# Altium footprint library Library 3D.PcbLib: 288 footprints (part 12 of 18)
Each footprint in its own frame and in the unit in brackets; x right, y up, seen from the top. Pads: shape width x height; smd on the part's side, far side on the other; paste and mask are expansions set on the pad; w line width, h text height; cw(c..) or ccw(c..) is an arc to the next point about the centre after c.
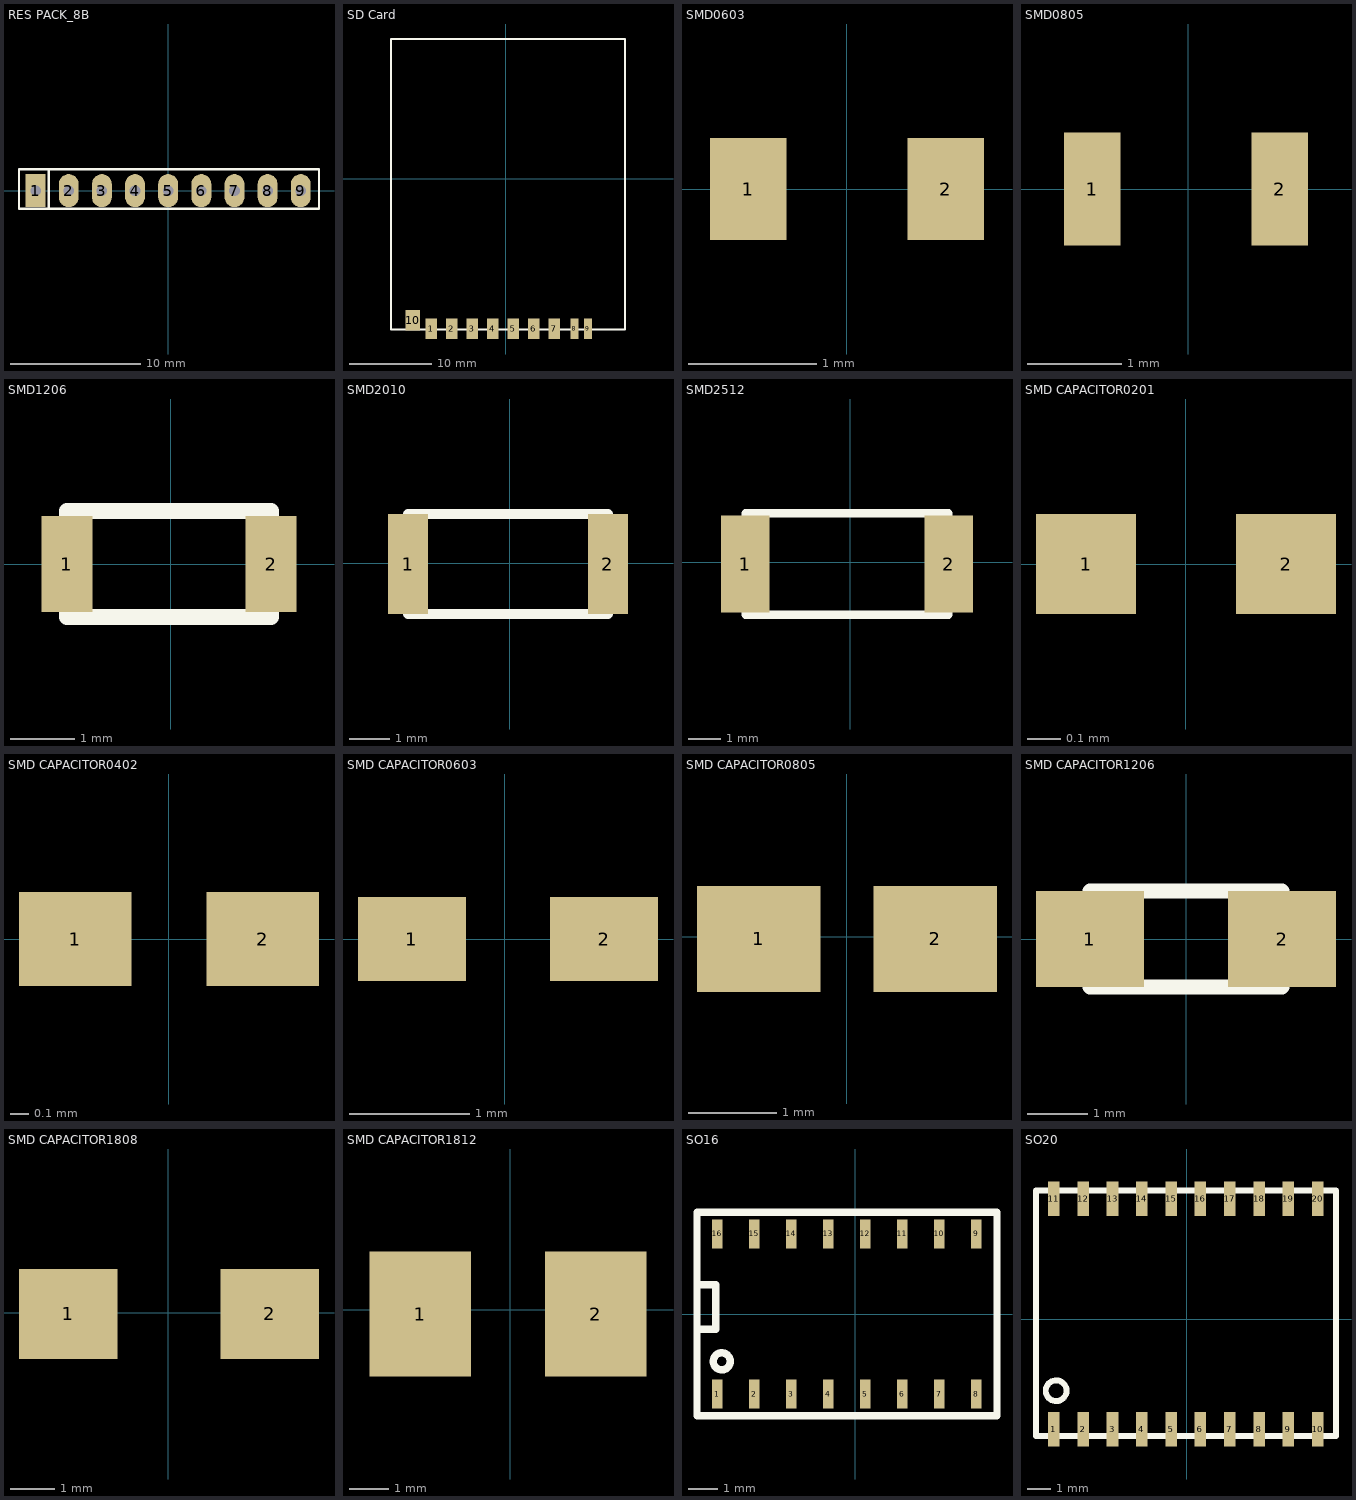
[diagram p11: the footprints below, top view; thin cyan lines are the x and y axes]

## RES PACK_8B [mil]
pads (9):
  rect 60x100 hole 32: 1(-400,0.98)
  oval 60x100 hole 32: 2(-300,0.98) 3(-200,0.98) 4(-100,0.98) 5(0,0.98) 6(100,0.98) 7(200,0.98) 8(300,0.98) 9(400,0.98)
Top Overlay:
  lines w7: -360,-54.02 -360,65.98 ; -450,-54.02 455,-54.02 455,65.98 -450,65.98 -450,-54.02
3D body "SW3dPS-Resistor Networks-1.STEP": height 259.29, standoff -75.35, extent -442.91,-19.02 442.91,30.2

## SD Card [mm]
pads (10):
  rect 1.4x2.5 smd: 1(-9.108,-18.332) 2(-6.619,-18.332) 3(-4.104,-18.332) 4(-1.615,-18.332) 5(0.925,-18.332) 6(3.389,-18.332) 7(5.929,-18.332)
  rect 1x2.5 smd: 8(8.393,-18.332) 9(10.044,-18.332)
  rect 1.8x2.5 smd: 10(-11.394,-17.265)
Top Overlay:
  lines w0.254: -14.035,-18.403 14.565,-18.403 14.565,17.097 -14.035,17.097 -14.035,-18.403
3D body "SW3dPS-SD SOKET HAFIZALI.STEP": height 3.01, standoff -0.99, extent -14.035,-18.403 14.565,17.097

## SMD0603 [mm]
pads (2):
  rect 0.6x0.8 smd: 1(-0.775,0) 2(0.775,0)
3D body "User Library-RESC1608X05N.STEP": height 0.45, standoff 0, extent -0.775,-0.425 0.775,0.425

## SMD0805 [mm]
pads (2):
  rect 0.6x1.2 smd: 1(-1.025,0) 2(0.975,0)
3D body "User Library-RESC2012X05N.STEP": height 0.45, standoff 0, extent -1.025,-0.625 0.975,0.625

## SMD1206 [mm]
pads (2):
  rect 0.8x1.5 smd: 1(-1.625,0) 2(1.575,0)
Top Overlay:
  lines w0.254: -1.625,-0.83 -1.625,0.83 1.575,0.83 1.575,-0.83 -1.625,-0.83
3D body "SMD 1206.STEP": height 0.53, standoff -0.03, extent -1.625,-0.83 1.575,0.83

## SMD2010 [mm]
pads (2):
  rect 1x2.5 smd: 1(-2.55,-0.025) 2(2.45,-0.025)
Top Overlay:
  lines w0.254: -2.55,-1.275 2.45,-1.275 2.45,1.225 -2.55,1.225 -2.55,-1.275
3D body "SMD2010.STEP": height 0.56, standoff 0, extent -2.55,-1.275 2.45,1.225

## SMD2512 [mm]
pads (2):
  rect 1.5x3 smd: 1(-3.248,-0.056) 2(3.052,-0.056)
Top Overlay:
  lines w0.254: -3.248,-1.631 3.052,-1.631 3.052,1.519 -3.248,1.519 -3.248,-1.631
3D body "SMD2512.STEP": height 0.82, standoff 0.22, extent -3.248,-1.631 3.052,1.519

## SMD CAPACITOR0201 [mm]
pads (2):
  rect 0.3x0.3 smd: 1(-0.3,0) 2(0.3,0)
3D body "User Library-SMD CAPACITOR.STEP": height 0.27, standoff -0.03, extent -0.3,-0.15 0.3,0.15

## SMD CAPACITOR0402 [mm]
pads (2):
  rect 0.6x0.5 smd: 1(-0.5,0) 2(0.5,0)
3D body "User Library-SMD CAPACITOR0402.STEP": height 0.37, standoff -0.13, extent -0.5,-0.25 0.5,0.25

## SMD CAPACITOR0603 [mm]
pads (2):
  rect 0.9x0.7 smd: 1(-0.775,0) 2(0.825,0)
3D body "User Library-SMD CAPACITOR0603.STEP": height 0.4, standoff -0.4, extent -0.775,-0.4 0.825,0.4

## SMD CAPACITOR0805 [mm]
pads (2):
  rect 1.4x1.2 smd: 1(-1,-0.025) 2(1,-0.025)
3D body "User Library-SMD CAPACITOR0805.STEP": height 0.3, standoff -0.3, extent -1,-0.65 1,0.6

## SMD CAPACITOR1206 [mm]
pads (2):
  rect 1.8x1.6 smd: 1(-1.6,0) 2(1.6,0)
Top Overlay:
  lines w0.254: -1.6,-0.8 1.6,-0.8 1.6,0.8 -1.6,0.8 -1.6,-0.8
3D body "User Library-SMD CAPACITOR1206.STEP": height 0.75, standoff -0.03, extent -1.6,-0.8 1.6,0.8

## SMD CAPACITOR1808 [mm]
pads (2):
  rect 2.2x2 smd: 1(-2.23,-0.031) 2(2.27,-0.031)
3D body "User Library-SMD CAPACITOR1808.STEP": height 0.45, standoff -0.45, extent -2.23,-1.031 2.27,0.969

## SMD CAPACITOR1812 [mm]
pads (2):
  rect 2.6x3.2 smd: 1(-2.308,-0.107) 2(2.192,-0.107)
3D body "User Library-SMD CAPACITOR1812.STEP": height 0.5, standoff -0.5, extent -2.308,-1.707 2.192,1.493

## SO16 [mm]
pads (16):
  rect 0.35x1 smd: 1(-4.73,-2.75) 2(-3.46,-2.75) 3(-2.19,-2.75) 4(-0.92,-2.75) 5(0.35,-2.75) 6(1.62,-2.75) 7(2.89,-2.75) 8(4.16,-2.75) 9(4.16,2.75) 10(2.89,2.75) 11(1.62,2.75) 12(0.35,2.75) 13(-0.92,2.75) 14(-2.19,2.75) 15(-3.46,2.75) 16(-4.73,2.75)
Top Overlay:
  circle w0.254: c-4.575,-1.625 r0.293
  lines w0.254: -5.425,1 -4.775,1 -4.775,-0.525 -5.375,-0.525 ; -5.425,-3.5 4.875,-3.5 4.875,3.5 -5.425,3.5 -5.425,-3.5
3D body "User Library-so16-1.STEP": height 1.75, standoff -0.02, extent -5.26,-3.068 4.71,3.069

## SO20 [mm]
pads (20):
  rect 0.5x1.5 smd: 1(-5.75,-4.775) 2(-4.48,-4.775) 3(-3.21,-4.775) 4(-1.94,-4.775) 5(-0.67,-4.775) 6(0.6,-4.775) 7(1.87,-4.775) 8(3.14,-4.775) 9(4.41,-4.775) 10(5.68,-4.775) 11(-5.75,5.225) 12(-4.48,5.225) 13(-3.21,5.225) 14(-1.94,5.225) 15(-0.67,5.225) 16(0.6,5.225) 17(1.87,5.225) 18(3.14,5.225) 19(4.41,5.225) 20(5.68,5.225)
Top Overlay:
  circle w0.254: c-5.651,-3.1 r0.451
  lines w0.254: -6.525,-5.055 -6.525,5.575 6.475,5.575 6.475,-5.055 -6.525,-5.055
3D body "User Library-SOIC20_JEDEC_MS-013AC.STEP": height 2.66, standoff 0, extent -6.525,-5.055 6.475,5.575